# Altium schematic symbol library LATTICEPLDS_Library.SchLib: 291 symbols (part 5 of 32) (continued)
## LCMXO2-4000/7000-BG332 (continued)
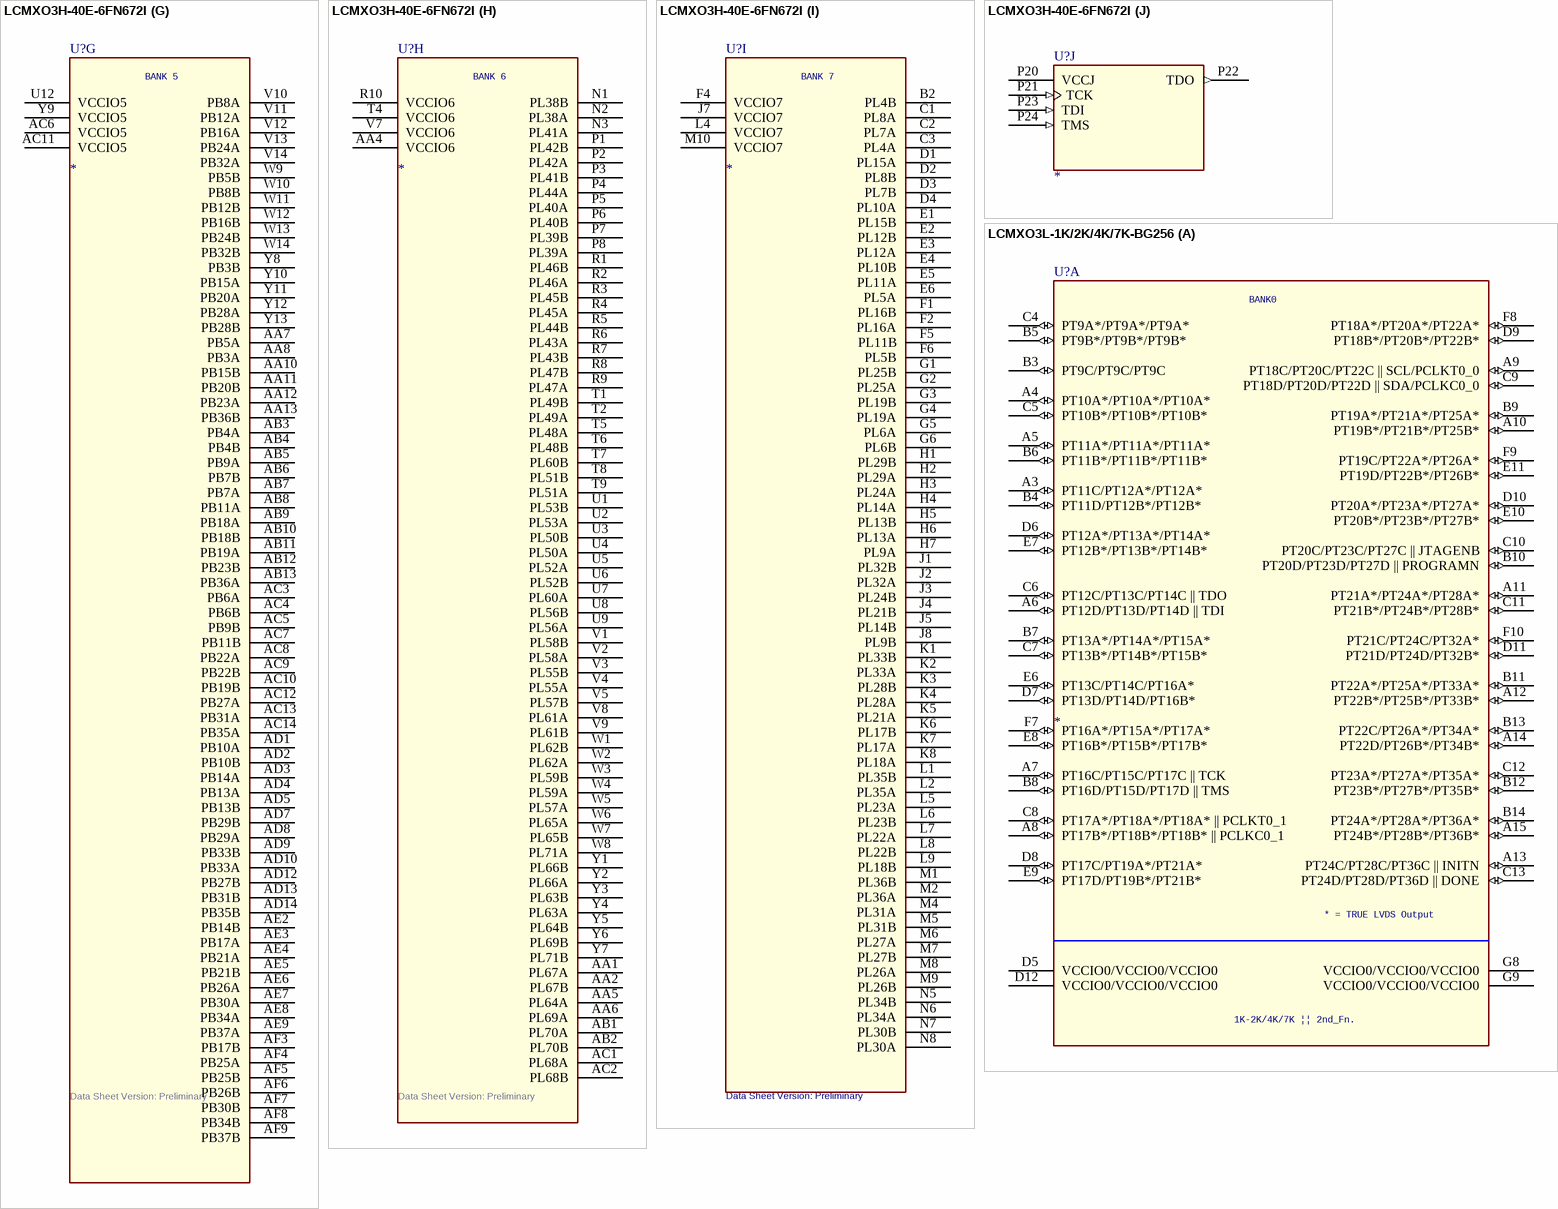
[diagram p49: symbols LCMXO3H-40E-6FN672I to LCMXO3L-1K/2K/4K/7K-BG256]
part A text: BANK0; * = TRUE LVDS Output; 4000/7000 || 2nd_Fn.
part B text: BANK1; DQ0; DQ1; 4000/7000 || 2nd_Fn.
part C text: BANK2; 4000/7000 || 2nd_Fn.
part D text: BANK3; 4000/7000 || 2nd_Fn.
part E text: BANK4; 4000/7000 || 2nd_Fn.
part F text: BANK5; 4000/7000 || 2nd_Fn.
part G text: 4000/7000

## LCMXO3H-40E-6FN672I
designator U?  Data Sheet Version: Preliminary
SWAP_INFO: (S1+S2+S3+S4+S5+S6+S7+S8+S9+S10); SPLIT_INST: TRUE
part A pins: A2 GND (power), A25 GND (power), AA3 GND (power), AA9 GND (power), AA18 GND (power), AA24 GND (power), AD6 GND (power), AD11 GND (power), AD16 GND (power), AD21 GND (power), AE1 GND (power), AE26 GND (power), AF2 GND (power), AF25 GND (power), B1 GND (power), B26 GND (power), C6 GND (power), C11 GND (power), C16 GND (power), C21 GND (power), D5 NC, F3 GND (power), F9 GND (power), F18 GND (power), F24 GND (power), J6 GND (power), J21 GND (power), K10 VCCAUX (power), K11 GND (power), K13 GND (power), K14 GND (power), K16 GND (power), K17 VCCAUX (power), L3 GND (power), L10 VCCAUX (power), L11 GND (power), L12 VCC (power), L13 VCC (power), L14 VCC (power), L15 VCC (power), L16 GND (power), L17 VCCAUX (power), L24 GND (power), M3 CFG0, M11 VCC (power), M12 VCC (power), M13 GND (power), M14 GND (power), M15 VCC (power), M16 VCC (power), N4 TOE, N9 GND (power), N10 GND (power), N11 VCC (power), N12 GND (power), N13 GND (power), N14 GND (power), N15 GND (power), N16 VCC (power), N17 GND (power), N18 GND (power), P9 GND (power), P10 GND (power), P11 VCC (power), P12 GND (power), P13 GND (power), P14 GND (power), P15 GND (power), P16 VCC (power), P17 GND (power), P18 GND (power), R11 VCC (power), R12 VCC (power), R13 GND (power), R14 GND (power), R15 VCC (power), R16 VCC (power), T3 GND (power), T10 VCCAUX (power), T11 GND (power), T12 VCC (power), T13 VCC (power), T14 VCC (power), T15 VCC (power), T16 GND (power), T17 VCCAUX (power), T24 GND (power), U10 VCCAUX (power), U11 GND (power), U13 GND (power), U14 GND (power), U16 GND (power), U17 VCCAUX (power), V6 GND (power), V21 GND (power)
part B pins: A3 PT4B, A4 PT9A, A5 PT9B, A6 PT10B, A7 PT14A, A8 PT17A, A9 PT18A, A10 PT22A, A11 PT25A, A12 PT26A, A13 PT29A, A14 PT33A, B3 PT4A, B4 PT6A, B5 PT6B, B6 PT10A, B7 PT14B, B8 PT17B, B9 PT18B, B10 PT22B, B11 PT25B, B12 PT26B, B13 PT29B, B14 PT33B, C4 PT5A, C5 PT5B, C7 PT7B, C8 PT13A, C9 PT15B, C10 PT21A, C12 PT30A, C13 PT34A, C14 PT37A, C15 PT37B, D6 VCCIO0 (power), D7 PT7A, D8 PT13B, D9 PT15A, D10 PT21B, D11 VCCIO0 (power), D12 PT30B, D13 PT34B, E7 PT11A, E8 PT11B, E9 PT16A, E10 PT16B, E11 PT27B, E12 PT31B, E13 PT35B, F7 PT3A, F8 PT8B, F10 PT23B, F11 PT27A, F12 PT31A, F13 PT35A, G7 PT3B, G8 PT8A, G9 VCCIO0 (power), G10 PT19B, G11 PT23A, G12 PT32A, G13 PT32B, H8 PT12B, H9 PT12A, H10 PT19A, H11 PT24A, H12 PT28A, H13 PT36B, J9 PT20A, J10 PT24B, J11 PT28B, J12 PT36A, K9 PT20B, K12 VCCIO0 (power)
part C pins: A15 PT38A, A16 PT41A, A17 PT42A, A18 PT45A, A19 PT46A, A20 PT53A, A21 PT58A, A22 PT61A, A23 PT61B, A24 PT62B, B15 PT38B, B16 PT41B, B17 PT42B, B18 PT45B, B19 PT46B, B20 PT53B, B21 PT58B, B22 PT63A, B23 PT62A, B24 PT65B, B25 PT66B, C17 PT47B, C18 PT49A, C19 PT50A, C20 PT54A, C22 PT63B, C23 PT65A, C24 PT66A, C25 PT71A, C26 PT71B, D14 PT39B, D15 PT43B, D16 VCCIO1 (power), D17 PT47A, D18 PT49B, D19 PT50B, D20 PT54B, D21 VCCIO1 (power), D22 PT67A, D23 PT69A, E14 PT43A, E15 PT48A, E16 PT51B, E17 PT55B, E18 PT55A, E19 PT57A, E20 PT59B, E21 PT59A, E22 PT67B, E23 PT69B, F14 PT39A, F15 PT48B, F16 PT51A, F17 PT56B, F19 PT57B, F20 PT70A, G14 PT44A, G15 PT44B, G16 PT56A, G17 PT64A, G18 VCCIO1 (power), G19 PT70B, G20 PT72B, H14 PT40B, H15 PT52B, H16 PT64B, H17 PT68B, H18 PT68A, H19 PT72A, J13 PT40A, J14 PT52A, J15 PT60A, J16 PT60B, K15 VCCIO1 (power)
part D pins: D24 PR4A, D25 PR7A, D26 PR7B, E24 PR4B, E25 PR8A, E26 PR8B, F21 PR6B, F22 PR5B, F23 VCCIO2 (power), F25 PR12A, F26 PR12B, G21 PR5A, G22 PR6A, G23 PR11B, G24 PR11A, G25 PR15B, G26 PR15A, H20 PR9A, H21 PR9B, H22 PR13A, H23 PR14B, H24 PR14A, H25 PR19B, H26 PR19A, J17 PR22A, J18 PR10B, J19 PR10A, J20 VCCIO2 (power), J22 PR13B, J23 PR16B, J24 PR16A, J25 PR24B, J26 PR24A, K18 PR22B, K19 PR17B, K20 PR17A, K21 PR18B, K22 PR18A, K23 PR21B, K24 PR21A, K25 PR25B, K26 PR25A, L18 PR30A, L19 PR26B, L20 PR26A, L21 PR23B, L22 PR23A, L23 VCCIO2 (power), L25 PR28B, L26 PR28A, M17 VCCIO2 (power), M18 PR31B, M19 PR30B, M20 PR31A, M21 PR27B, M22 PR27A, M23 PR29B, M24 PR29A, M25 PR32B, M26 PR32A, N19 PR35B, N20 PR35A, N21 PR34A, N22 PR34B, N23 PR33B, N24 PR33A, N25 PR36B, N26 PR36A
part E pins: AA21 PR67B, AA22 PR69A, AA23 VCCIO3 (power), AA25 PR55B, AA26 PR55A, AB21 PR69B, AB22 PR71B, AB23 PR62B, AB24 PR62A, AB25 PR58B, AB26 PR58A, AC22 PR71A, AC23 PR63B, AC24 PR63A, AC25 PR59B, AC26 PR59A, AD23 PR70B, AD24 PR70A, AD25 PR66B, AD26 PR66A, P19 PR39A, P25 PR38B, P26 PR38A, R17 VCCIO3 (power), R18 PR39B, R19 PR43A, R20 PR43B, R21 PR40B, R22 PR40A, R23 PR42B, R24 PR42A, R25 PR41B, R26 PR41A, T18 PR47A, T19 PR47B, T20 PR51B, T21 PR51A, T22 PR44B, T23 VCCIO3 (power), T25 PR45B, T26 PR45A, U18 PR56A, U19 PR56B, U20 PR60B, U21 PR60A, U22 PR44A, U23 PR48B, U24 PR48A, U25 PR46B, U26 PR46A, V19 PR68A, V20 VCCIO3 (power), V22 PR64A, V23 PR52B, V24 PR52A, V25 PR49B, V26 PR49A, W20 PR68B, W21 PR64B, W22 PR65A, W23 PR57B, W24 PR57A, W25 PR50B, W26 PR50A, Y21 PR65B, Y22 PR67A, Y23 PR61B, Y24 PR61A, Y25 PR53B, Y26 PR53A
part F pins: AA14 PB39A, AA15 PB44B, AA16 PB47A, AA17 PB59A, AA19 PB68A, AA20 PB71B, AB14 PB39B, AB15 PB44A, AB16 PB47B, AB17 PB59B, AB18 PB63A, AB19 PB63B, AB20 PB71A, AC15 PB43A, AC16 VCCIO4 (power), AC17 PB51A, AC18 PB55A, AC19 PB67A, AC20 PB70B, AC21 VCCIO4 (power), AD15 PB43B, AD17 PB51B, AD18 PB55B, AD19 PB67B, AD20 PB70A, AD22 PB69B, AE10 PB38A, AE11 PB41A, AE12 PB42A, AE13 PB45A, AE14 PB46A, AE15 PB49A, AE16 PB50A, AE17 PB53A, AE18 PB54A, AE19 PB57A, AE20 PB58A, AE21 PB61B, AE22 PB62B, AE23 PB69A, AE24 PB66B, AE25 PB66A, AF10 PB38B, AF11 PB41B, AF12 PB42B, AF13 PB45B, AF14 PB46B, AF15 PB49B, AF16 PB50B, AF17 PB53B, AF18 PB54B, AF19 PB57B, AF20 PB58B, AF21 PB61A, AF22 PB62A, AF23 PB65A, AF24 PB65B, U15 VCCIO4 (power), V15 PB40A, V16 PB52A, V17 PB60A, V18 PB64A, W15 PB40B, W16 PB52B, W17 PB60B, W18 PB64B, W19 PB72A, Y14 PB48A, Y15 PB48B, Y16 PB56A, Y17 PB56B, Y18 VCCIO4 (power), Y19 PB68B, Y20 PB72B
part G pins: AA7 PB5A, AA8 PB3A, AA10 PB15B, AA11 PB20B, AA12 PB23A, AA13 PB36B, AB3 PB4A, AB4 PB4B, AB5 PB9A, AB6 PB7B, AB7 PB7A, AB8 PB11A, AB9 PB18A, AB10 PB18B, AB11 PB19A, AB12 PB23B, AB13 PB36A, AC3 PB6A, AC4 PB6B, AC5 PB9B, AC6 VCCIO5 (power), AC7 PB11B, AC8 PB22A, AC9 PB22B, AC10 PB19B, AC11 VCCIO5 (power), AC12 PB27A, AC13 PB31A, AC14 PB35A, AD1 PB10A, AD2 PB10B, AD3 PB14A, AD4 PB13A, AD5 PB13B, AD7 PB29B, AD8 PB29A, AD9 PB33B, AD10 PB33A, AD12 PB27B, AD13 PB31B, AD14 PB35B, AE2 PB14B, AE3 PB17A, AE4 PB21A, AE5 PB21B, AE6 PB26A, AE7 PB30A, AE8 PB34A, AE9 PB37A, AF3 PB17B, AF4 PB25A, AF5 PB25B, AF6 PB26B, AF7 PB30B, AF8 PB34B, AF9 PB37B, U12 VCCIO5 (power), V10 PB8A, V11 PB12A, V12 PB16A, V13 PB24A, V14 PB32A, W9 PB5B, W10 PB8B, W11 PB12B, W12 PB16B, W13 PB24B, W14 PB32B, Y8 PB3B, Y9 VCCIO5 (power), Y10 PB15A, Y11 PB20A, Y12 PB28A, Y13 PB28B
part H pins: AA1 PL67A, AA2 PL67B, AA4 VCCIO6 (power), AA5 PL64A, AA6 PL69A, AB1 PL70A, AB2 PL70B, AC1 PL68A, AC2 PL68B, N1 PL38B, N2 PL38A, N3 PL41A, P1 PL42B, P2 PL42A, P3 PL41B, P4 PL44A, P5 PL40A, P6 PL40B, P7 PL39B, P8 PL39A, R1 PL46B, R2 PL46A, R3 PL45B, R4 PL45A, R5 PL44B, R6 PL43A, R7 PL43B, R8 PL47B, R9 PL47A, R10 VCCIO6 (power), T1 PL49B, T2 PL49A, T4 VCCIO6 (power), T5 PL48A, T6 PL48B, T7 PL60B, T8 PL51B, T9 PL51A, U1 PL53B, U2 PL53A, U3 PL50B, U4 PL50A, U5 PL52A, U6 PL52B, U7 PL60A, U8 PL56B, U9 PL56A, V1 PL58B, V2 PL58A, V3 PL55B, V4 PL55A, V5 PL57B, V7 VCCIO6 (power), V8 PL61A, V9 PL61B, W1 PL62B, W2 PL62A, W3 PL59B, W4 PL59A, W5 PL57A, W6 PL65A, W7 PL65B, W8 PL71A, Y1 PL66B, Y2 PL66A, Y3 PL63B, Y4 PL63A, Y5 PL64B, Y6 PL69B, Y7 PL71B
part I pins: B2 PL4B, C1 PL8A, C2 PL7A, C3 PL4A, D1 PL15A, D2 PL8B, D3 PL7B, D4 PL10A, E1 PL15B, E2 PL12B, E3 PL12A, E4 PL10B, E5 PL11A, E6 PL5A, F1 PL16B, F2 PL16A, F4 VCCIO7 (power), F5 PL11B, F6 PL5B, G1 PL25B, G2 PL25A, G3 PL19B, G4 PL19A, G5 PL6A, G6 PL6B, H1 PL29B, H2 PL29A, H3 PL24A, H4 PL14A, H5 PL13B, H6 PL13A, H7 PL9A, J1 PL32B, J2 PL32A, J3 PL24B, J4 PL21B, J5 PL14B, J7 VCCIO7 (power), J8 PL9B, K1 PL33B, K2 PL33A, K3 PL28B, K4 PL28A, K5 PL21A, K6 PL17B, K7 PL17A, K8 PL18A, L1 PL35B, L2 PL35A, L4 VCCIO7 (power), L5 PL23A, L6 PL23B, L7 PL22A, L8 PL22B, L9 PL18B, M1 PL36B, M2 PL36A, M4 PL31A, M5 PL31B, M6 PL27A, M7 PL27B, M8 PL26A, M9 PL26B, M10 VCCIO7 (power), N5 PL34B, N6 PL34A, N7 PL30B, N8 PL30A
part J pins: P20 VCCJ (power), P21 TCK (in), P22 TDO (out), P23 TDI (in), P24 TMS (in)
part A text: SUPPLIES
part B text: BANK 0
part C text: BANK 1
part D text: BANK 2
part E text: BANK 3
part F text: BANK 4
part G text: BANK 5
part H text: BANK 6
part I text: BANK 7

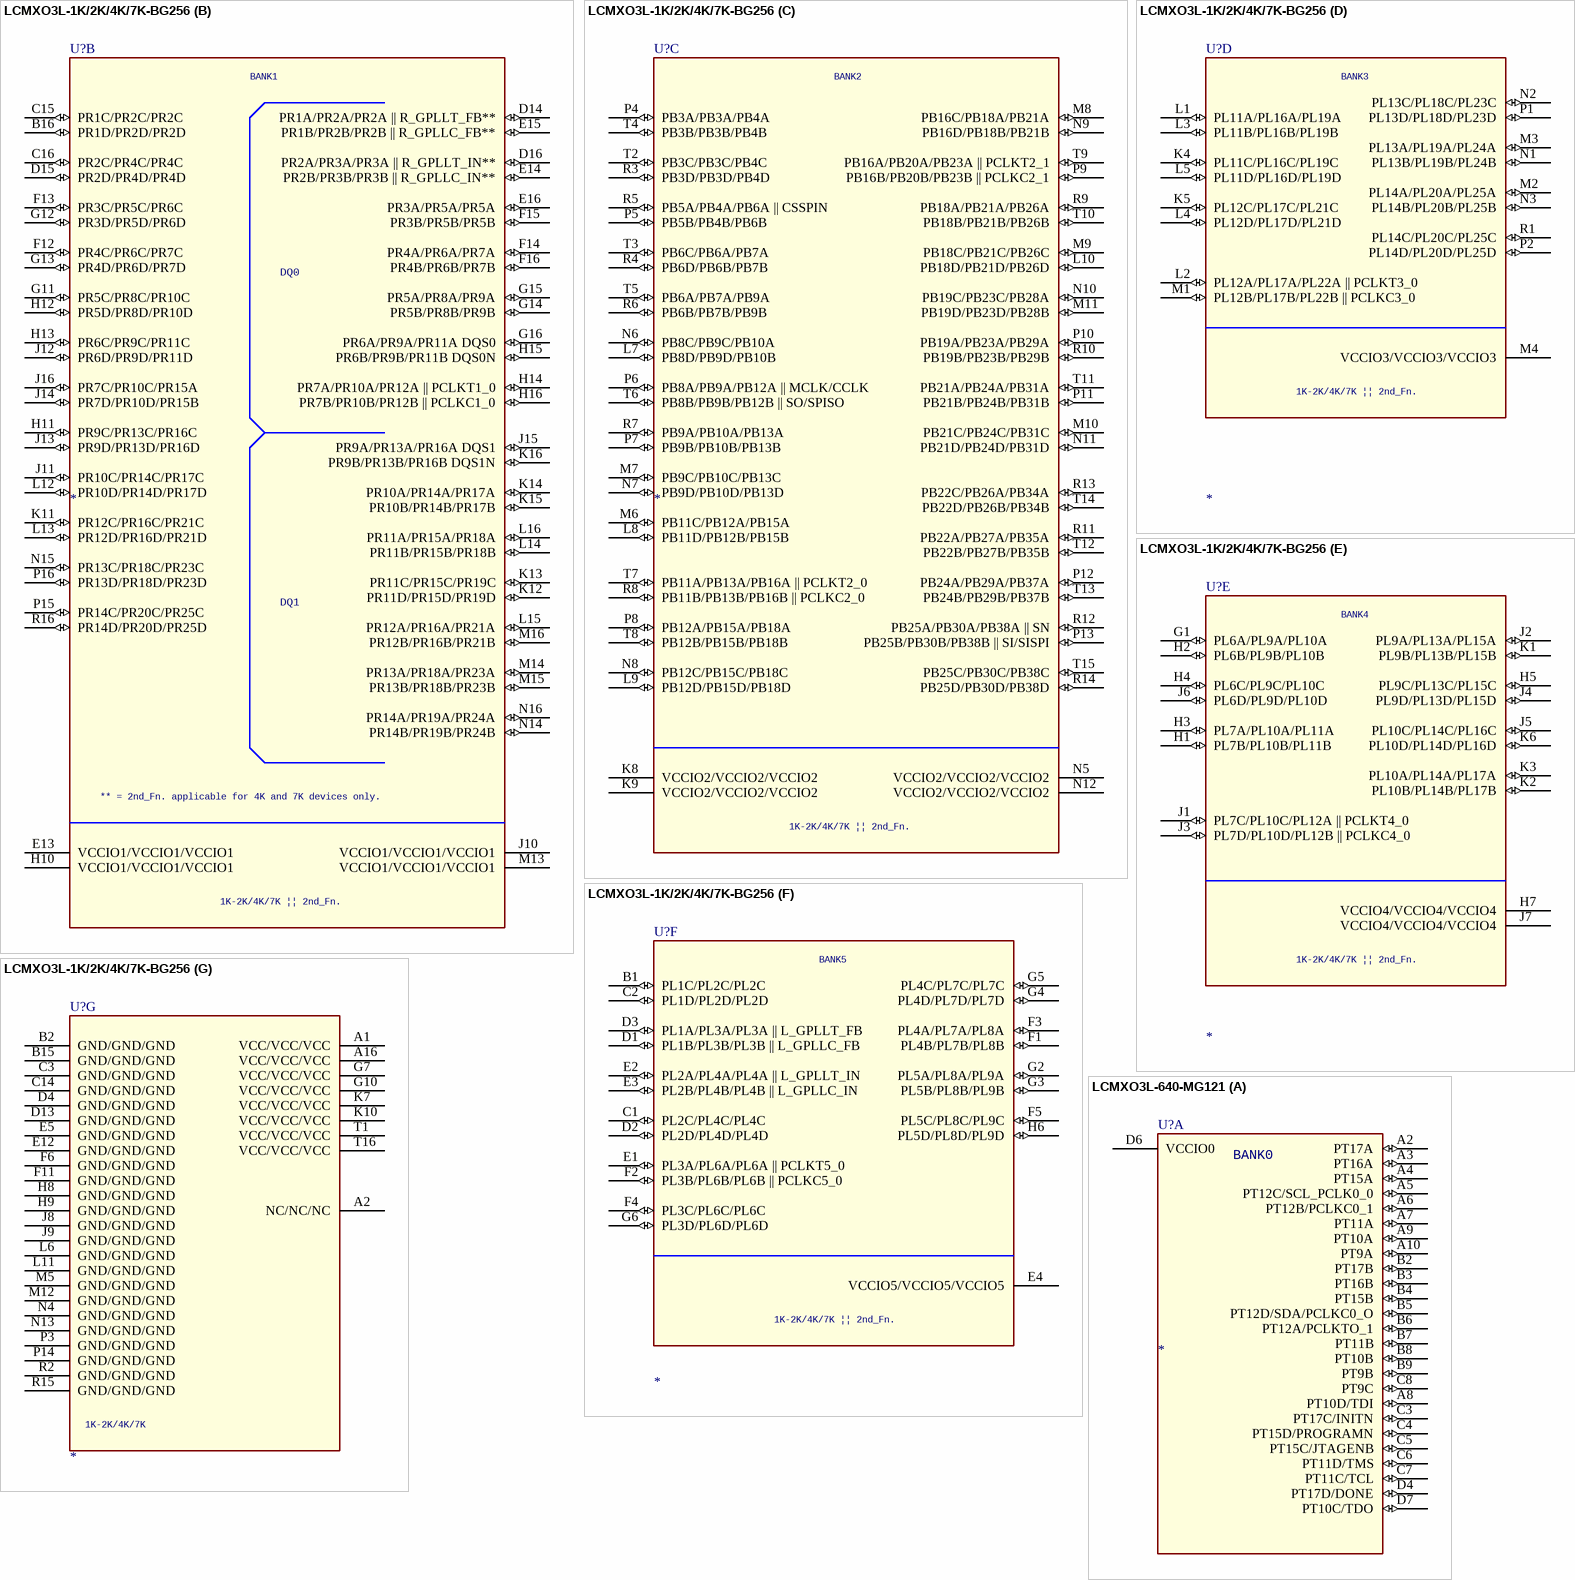
[diagram p50: symbols LCMXO3L-1K/2K/4K/7K-BG256 to LCMXO3L-640-MG121]

## LCMXO3L-1K/2K/4K/7K-BG256
designator U?
SWAP_INFO: (S1+S2+S3+S4+S5+S6+S7); SPLIT_INST: TRUE
part A pins: A3 PT11C/PT12A*/PT12A* (io), A4 PT10A*/PT10A*/PT10A* (io), A5 PT11A*/PT11A*/PT11A* (io), A6 PT12D/PT13D/PT14D || TDI (io), A7 PT16C/PT15C/PT17C || TCK (io), A8 PT17B*/PT18B*/PT18B* || PCLKC0_1 (io), A9 PT18C/PT20C/PT22C || SCL/PCLKT0_0 (io), A10 PT19B*/PT21B*/PT25B* (io), A11 PT21A*/PT24A*/PT28A* (io), A12 PT22B*/PT25B*/PT33B* (io), A13 PT24C/PT28C/PT36C || INITN (io), A14 PT22D/PT26B*/PT34B* (io), A15 PT24B*/PT28B*/PT36B* (io), B3 PT9C/PT9C/PT9C (io), B4 PT11D/PT12B*/PT12B* (io), B5 PT9B*/PT9B*/PT9B* (io), B6 PT11B*/PT11B*/PT11B* (io), B7 PT13A*/PT14A*/PT15A* (io), B8 PT16D/PT15D/PT17D || TMS (io), B9 PT19A*/PT21A*/PT25A* (io), B10 PT20D/PT23D/PT27D || PROGRAMN (io), B11 PT22A*/PT25A*/PT33A* (io), B12 PT23B*/PT27B*/PT35B* (io), B13 PT22C/PT26A*/PT34A* (io), B14 PT24A*/PT28A*/PT36A* (io), C4 PT9A*/PT9A*/PT9A* (io), C5 PT10B*/PT10B*/PT10B* (io), C6 PT12C/PT13C/PT14C || TDO (io), C7 PT13B*/PT14B*/PT15B* (io), C8 PT17A*/PT18A*/PT18A* || PCLKT0_1 (io), C9 PT18D/PT20D/PT22D || SDA/PCLKC0_0 (io), C10 PT20C/PT23C/PT27C || JTAGENB (io), C11 PT21B*/PT24B*/PT28B* (io), C12 PT23A*/PT27A*/PT35A* (io), C13 PT24D/PT28D/PT36D || DONE (io), D5 VCCIO0/VCCIO0/VCCIO0 (power), D6 PT12A*/PT13A*/PT14A* (io), D7 PT13D/PT14D/PT16B* (io), D8 PT17C/PT19A*/PT21A* (io), D9 PT18B*/PT20B*/PT22B* (io), D10 PT20A*/PT23A*/PT27A* (io), D11 PT21D/PT24D/PT32B* (io), D12 VCCIO0/VCCIO0/VCCIO0 (power), E6 PT13C/PT14C/PT16A* (io), E7 PT12B*/PT13B*/PT14B* (io), E8 PT16B*/PT15B*/PT17B* (io), E9 PT17D/PT19B*/PT21B* (io), E10 PT20B*/PT23B*/PT27B* (io), E11 PT19D/PT22B*/PT26B* (io), F7 PT16A*/PT15A*/PT17A* (io), F8 PT18A*/PT20A*/PT22A* (io), F9 PT19C/PT22A*/PT26A* (io), F10 PT21C/PT24C/PT32A* (io), G8 VCCIO0/VCCIO0/VCCIO0 (power), G9 VCCIO0/VCCIO0/VCCIO0 (power)
part B pins: B16 PR1D/PR2D/PR2D (io), C15 PR1C/PR2C/PR2C (io), C16 PR2C/PR4C/PR4C (io), D14 PR1A/PR2A/PR2A || R_GPLLT_FB** (io), D15 PR2D/PR4D/PR4D (io), D16 PR2A/PR3A/PR3A || R_GPLLT_IN** (io), E13 VCCIO1/VCCIO1/VCCIO1 (power), E14 PR2B/PR3B/PR3B || R_GPLLC_IN** (io), E15 PR1B/PR2B/PR2B || R_GPLLC_FB** (io), E16 PR3A/PR5A/PR5A (io), F12 PR4C/PR6C/PR7C (io), F13 PR3C/PR5C/PR6C (io), F14 PR4A/PR6A/PR7A (io), F15 PR3B/PR5B/PR5B (io), F16 PR4B/PR6B/PR7B (io), G11 PR5C/PR8C/PR10C (io), G12 PR3D/PR5D/PR6D (io), G13 PR4D/PR6D/PR7D (io), G14 PR5B/PR8B/PR9B (io), G15 PR5A/PR8A/PR9A (io), G16 PR6A/PR9A/PR11A DQS0 (io), H10 VCCIO1/VCCIO1/VCCIO1 (power), H11 PR9C/PR13C/PR16C (io), H12 PR5D/PR8D/PR10D (io), H13 PR6C/PR9C/PR11C (io), H14 PR7A/PR10A/PR12A || PCLKT1_0 (io), H15 PR6B/PR9B/PR11B DQS0N (io), H16 PR7B/PR10B/PR12B || PCLKC1_0 (io), J10 VCCIO1/VCCIO1/VCCIO1 (power), J11 PR10C/PR14C/PR17C (io), J12 PR6D/PR9D/PR11D (io), J13 PR9D/PR13D/PR16D (io), J14 PR7D/PR10D/PR15B (io), J15 PR9A/PR13A/PR16A DQS1 (io), J16 PR7C/PR10C/PR15A (io), K11 PR12C/PR16C/PR21C (io), K12 PR11D/PR15D/PR19D (io), K13 PR11C/PR15C/PR19C (io), K14 PR10A/PR14A/PR17A (io), K15 PR10B/PR14B/PR17B (io), K16 PR9B/PR13B/PR16B DQS1N (io), L12 PR10D/PR14D/PR17D (io), L13 PR12D/PR16D/PR21D (io), L14 PR11B/PR15B/PR18B (io), L15 PR12A/PR16A/PR21A (io), L16 PR11A/PR15A/PR18A (io), M13 VCCIO1/VCCIO1/VCCIO1 (power), M14 PR13A/PR18A/PR23A (io), M15 PR13B/PR18B/PR23B (io), M16 PR12B/PR16B/PR21B (io), N14 PR14B/PR19B/PR24B (io), N15 PR13C/PR18C/PR23C (io), N16 PR14A/PR19A/PR24A (io), P15 PR14C/PR20C/PR25C (io), P16 PR13D/PR18D/PR23D (io), R16 PR14D/PR20D/PR25D (io)
part C pins: K8 VCCIO2/VCCIO2/VCCIO2 (power), K9 VCCIO2/VCCIO2/VCCIO2 (power), L7 PB8D/PB9D/PB10B (io), L8 PB11D/PB12B/PB15B (io), L9 PB12D/PB15D/PB18D (io), L10 PB18D/PB21D/PB26D (io), M6 PB11C/PB12A/PB15A (io), M7 PB9C/PB10C/PB13C (io), M8 PB16C/PB18A/PB21A (io), M9 PB18C/PB21C/PB26C (io), M10 PB21C/PB24C/PB31C (io), M11 PB19D/PB23D/PB28B (io), N5 VCCIO2/VCCIO2/VCCIO2 (power), N6 PB8C/PB9C/PB10A (io), N7 PB9D/PB10D/PB13D (io), N8 PB12C/PB15C/PB18C (io), N9 PB16D/PB18B/PB21B (io), N10 PB19C/PB23C/PB28A (io), N11 PB21D/PB24D/PB31D (io), N12 VCCIO2/VCCIO2/VCCIO2 (power), P4 PB3A/PB3A/PB4A (io), P5 PB5B/PB4B/PB6B (io), P6 PB8A/PB9A/PB12A || MCLK/CCLK (io), P7 PB9B/PB10B/PB13B (io), P8 PB12A/PB15A/PB18A (io), P9 PB16B/PB20B/PB23B || PCLKC2_1 (io), P10 PB19A/PB23A/PB29A (io), P11 PB21B/PB24B/PB31B (io), P12 PB24A/PB29A/PB37A (io), P13 PB25B/PB30B/PB38B || SI/SISPI (io), R3 PB3D/PB3D/PB4D (io), R4 PB6D/PB6B/PB7B (io), R5 PB5A/PB4A/PB6A || CSSPIN (io), R6 PB6B/PB7B/PB9B (io), R7 PB9A/PB10A/PB13A (io), R8 PB11B/PB13B/PB16B || PCLKC2_0 (io), R9 PB18A/PB21A/PB26A (io), R10 PB19B/PB23B/PB29B (io), R11 PB22A/PB27A/PB35A (io), R12 PB25A/PB30A/PB38A || SN (io), R13 PB22C/PB26A/PB34A (io), R14 PB25D/PB30D/PB38D (io), T2 PB3C/PB3C/PB4C (io), T3 PB6C/PB6A/PB7A (io), T4 PB3B/PB3B/PB4B (io), T5 PB6A/PB7A/PB9A (io), T6 PB8B/PB9B/PB12B || SO/SPISO (io), T7 PB11A/PB13A/PB16A || PCLKT2_0 (io), T8 PB12B/PB15B/PB18B (io), T9 PB16A/PB20A/PB23A || PCLKT2_1 (io), T10 PB18B/PB21B/PB26B (io), T11 PB21A/PB24A/PB31A (io), T12 PB22B/PB27B/PB35B (io), T13 PB24B/PB29B/PB37B (io), T14 PB22D/PB26B/PB34B (io), T15 PB25C/PB30C/PB38C (io)
part D pins: K4 PL11C/PL16C/PL19C (io), K5 PL12C/PL17C/PL21C (io), L1 PL11A/PL16A/PL19A (io), L2 PL12A/PL17A/PL22A || PCLKT3_0 (io), L3 PL11B/PL16B/PL19B (io), L4 PL12D/PL17D/PL21D (io), L5 PL11D/PL16D/PL19D (io), M1 PL12B/PL17B/PL22B || PCLKC3_0 (io), M2 PL14A/PL20A/PL25A (io), M3 PL13A/PL19A/PL24A (io), M4 VCCIO3/VCCIO3/VCCIO3 (power), N1 PL13B/PL19B/PL24B (io), N2 PL13C/PL18C/PL23C (io), N3 PL14B/PL20B/PL25B (io), P1 PL13D/PL18D/PL23D (io), P2 PL14D/PL20D/PL25D (io), R1 PL14C/PL20C/PL25C (io)
part E pins: G1 PL6A/PL9A/PL10A (io), H1 PL7B/PL10B/PL11B (io), H2 PL6B/PL9B/PL10B (io), H3 PL7A/PL10A/PL11A (io), H4 PL6C/PL9C/PL10C (io), H5 PL9C/PL13C/PL15C (io), H7 VCCIO4/VCCIO4/VCCIO4 (power), J1 PL7C/PL10C/PL12A || PCLKT4_0 (io), J2 PL9A/PL13A/PL15A (io), J3 PL7D/PL10D/PL12B || PCLKC4_0 (io), J4 PL9D/PL13D/PL15D (io), J5 PL10C/PL14C/PL16C (io), J6 PL6D/PL9D/PL10D (io), J7 VCCIO4/VCCIO4/VCCIO4 (power), K1 PL9B/PL13B/PL15B (io), K2 PL10B/PL14B/PL17B (io), K3 PL10A/PL14A/PL17A (io), K6 PL10D/PL14D/PL16D (io)
part F pins: B1 PL1C/PL2C/PL2C (io), C1 PL2C/PL4C/PL4C (io), C2 PL1D/PL2D/PL2D (io), D1 PL1B/PL3B/PL3B || L_GPLLC_FB (io), D2 PL2D/PL4D/PL4D (io), D3 PL1A/PL3A/PL3A || L_GPLLT_FB (io), E1 PL3A/PL6A/PL6A || PCLKT5_0 (io), E2 PL2A/PL4A/PL4A || L_GPLLT_IN (io), E3 PL2B/PL4B/PL4B || L_GPLLC_IN (io), E4 VCCIO5/VCCIO5/VCCIO5 (power), F1 PL4B/PL7B/PL8B (io), F2 PL3B/PL6B/PL6B || PCLKC5_0 (io), F3 PL4A/PL7A/PL8A (io), F4 PL3C/PL6C/PL6C (io), F5 PL5C/PL8C/PL9C (io), G2 PL5A/PL8A/PL9A (io), G3 PL5B/PL8B/PL9B (io), G4 PL4D/PL7D/PL7D (io), G5 PL4C/PL7C/PL7C (io), G6 PL3D/PL6D/PL6D (io), H6 PL5D/PL8D/PL9D (io)
part G pins: A1 VCC/VCC/VCC (power), A2 NC/NC/NC, A16 VCC/VCC/VCC (power), B2 GND/GND/GND (power), B15 GND/GND/GND (power), C3 GND/GND/GND (power), C14 GND/GND/GND (power), D4 GND/GND/GND (power), D13 GND/GND/GND (power), E5 GND/GND/GND (power), E12 GND/GND/GND (power), F6 GND/GND/GND (power), F11 GND/GND/GND (power), G7 VCC/VCC/VCC (power), G10 VCC/VCC/VCC (power), H8 GND/GND/GND (power), H9 GND/GND/GND (power), J8 GND/GND/GND (power), J9 GND/GND/GND (power), K7 VCC/VCC/VCC (power), K10 VCC/VCC/VCC (power), L6 GND/GND/GND (power), L11 GND/GND/GND (power), M5 GND/GND/GND (power), M12 GND/GND/GND (power), N4 GND/GND/GND (power), N13 GND/GND/GND (power), P3 GND/GND/GND (power), P14 GND/GND/GND (power), R2 GND/GND/GND (power), R15 GND/GND/GND (power), T1 VCC/VCC/VCC (power), T16 VCC/VCC/VCC (power)
part A text: BANK0; * = TRUE LVDS Output; 1K-2K/4K/7K || 2nd_Fn.
part B text: BANK1; DQ0; DQ1; ** = 2nd_Fn. applicable for 4K and 7K devices only.; 1K-2K/4K/7K || 2nd_Fn.
part C text: BANK2; 1K-2K/4K/7K || 2nd_Fn.
part D text: BANK3; 1K-2K/4K/7K || 2nd_Fn.
part E text: BANK4; 1K-2K/4K/7K || 2nd_Fn.
part F text: BANK5; 1K-2K/4K/7K || 2nd_Fn.
part G text: 1K-2K/4K/7K

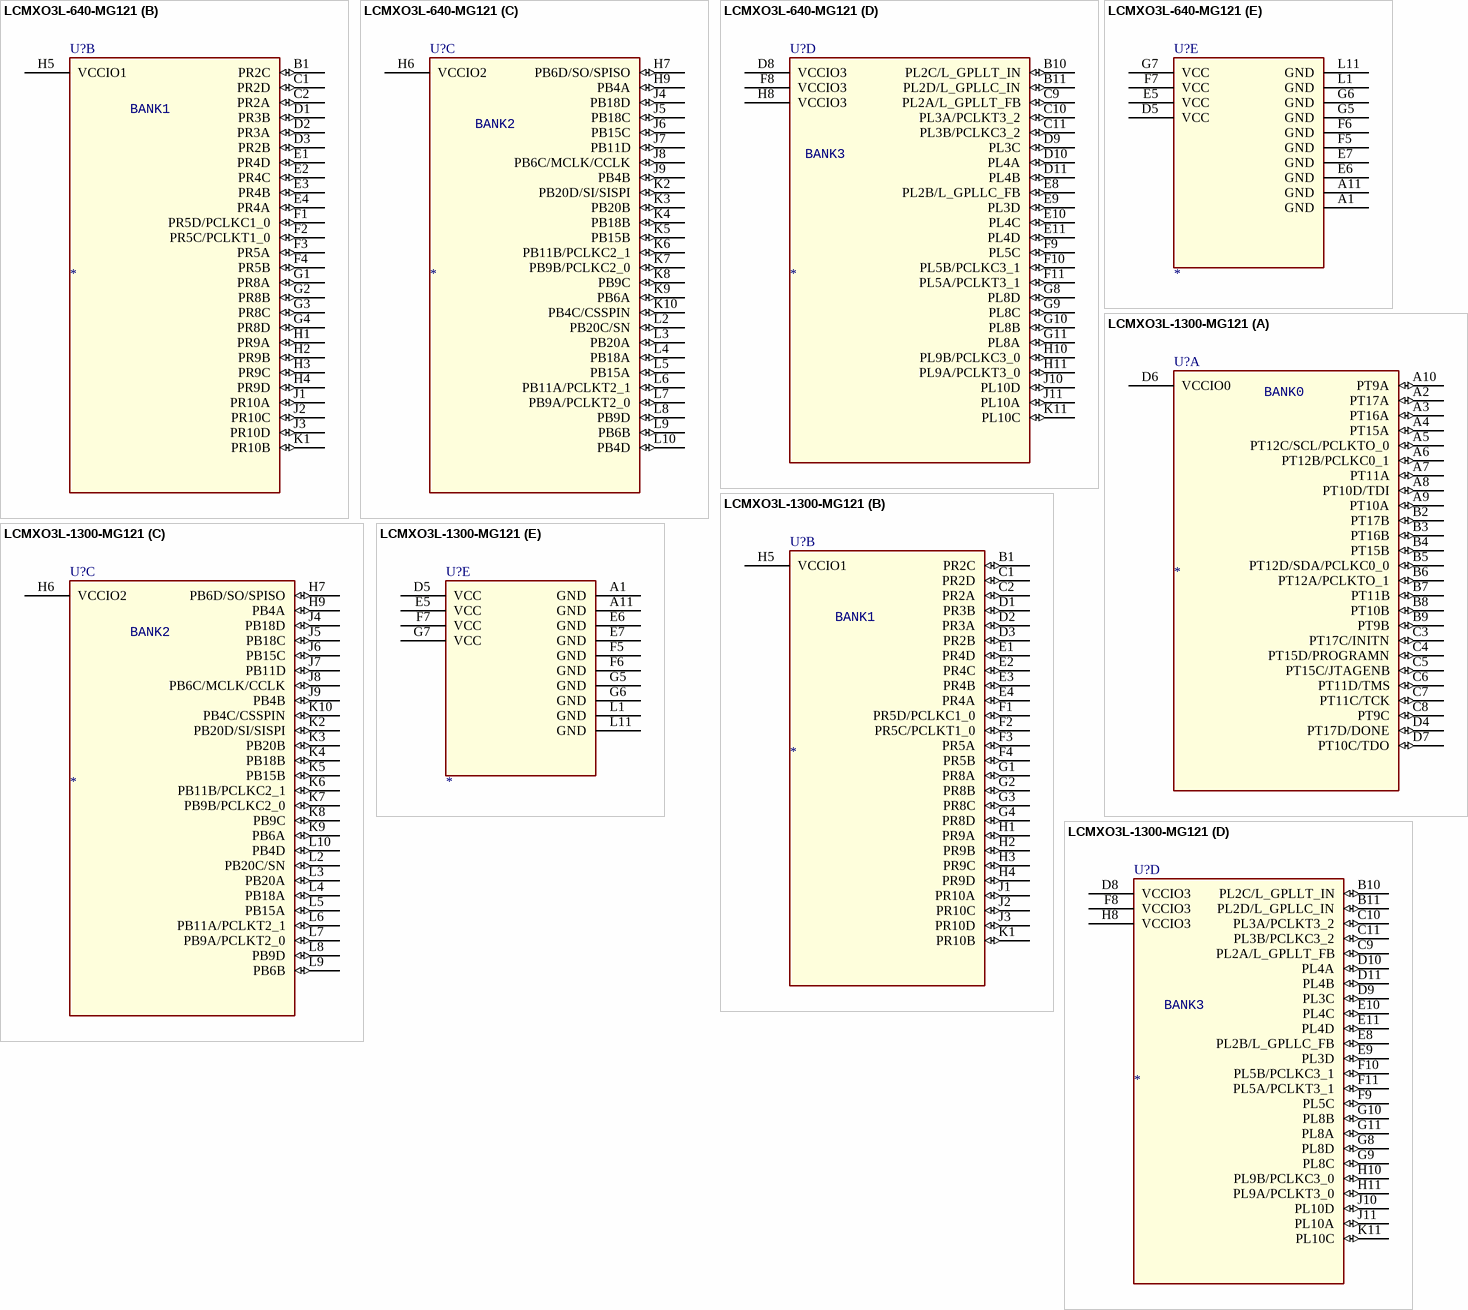
[diagram p51: symbols LCMXO3L-640-MG121 to LCMXO3L-1300-MG121]
